# Altium footprint library MyPcbLib.PcbLib: 657 footprints (part 22 of 42)
Each footprint in its own frame and in the unit in brackets; x right, y up, seen from the top. Pads: shape width x height; smd on the part's side, far side on the other; paste and mask are expansions set on the pad; w line width, h text height; cw(c..) or ccw(c..) is an arc to the next point about the centre after c.
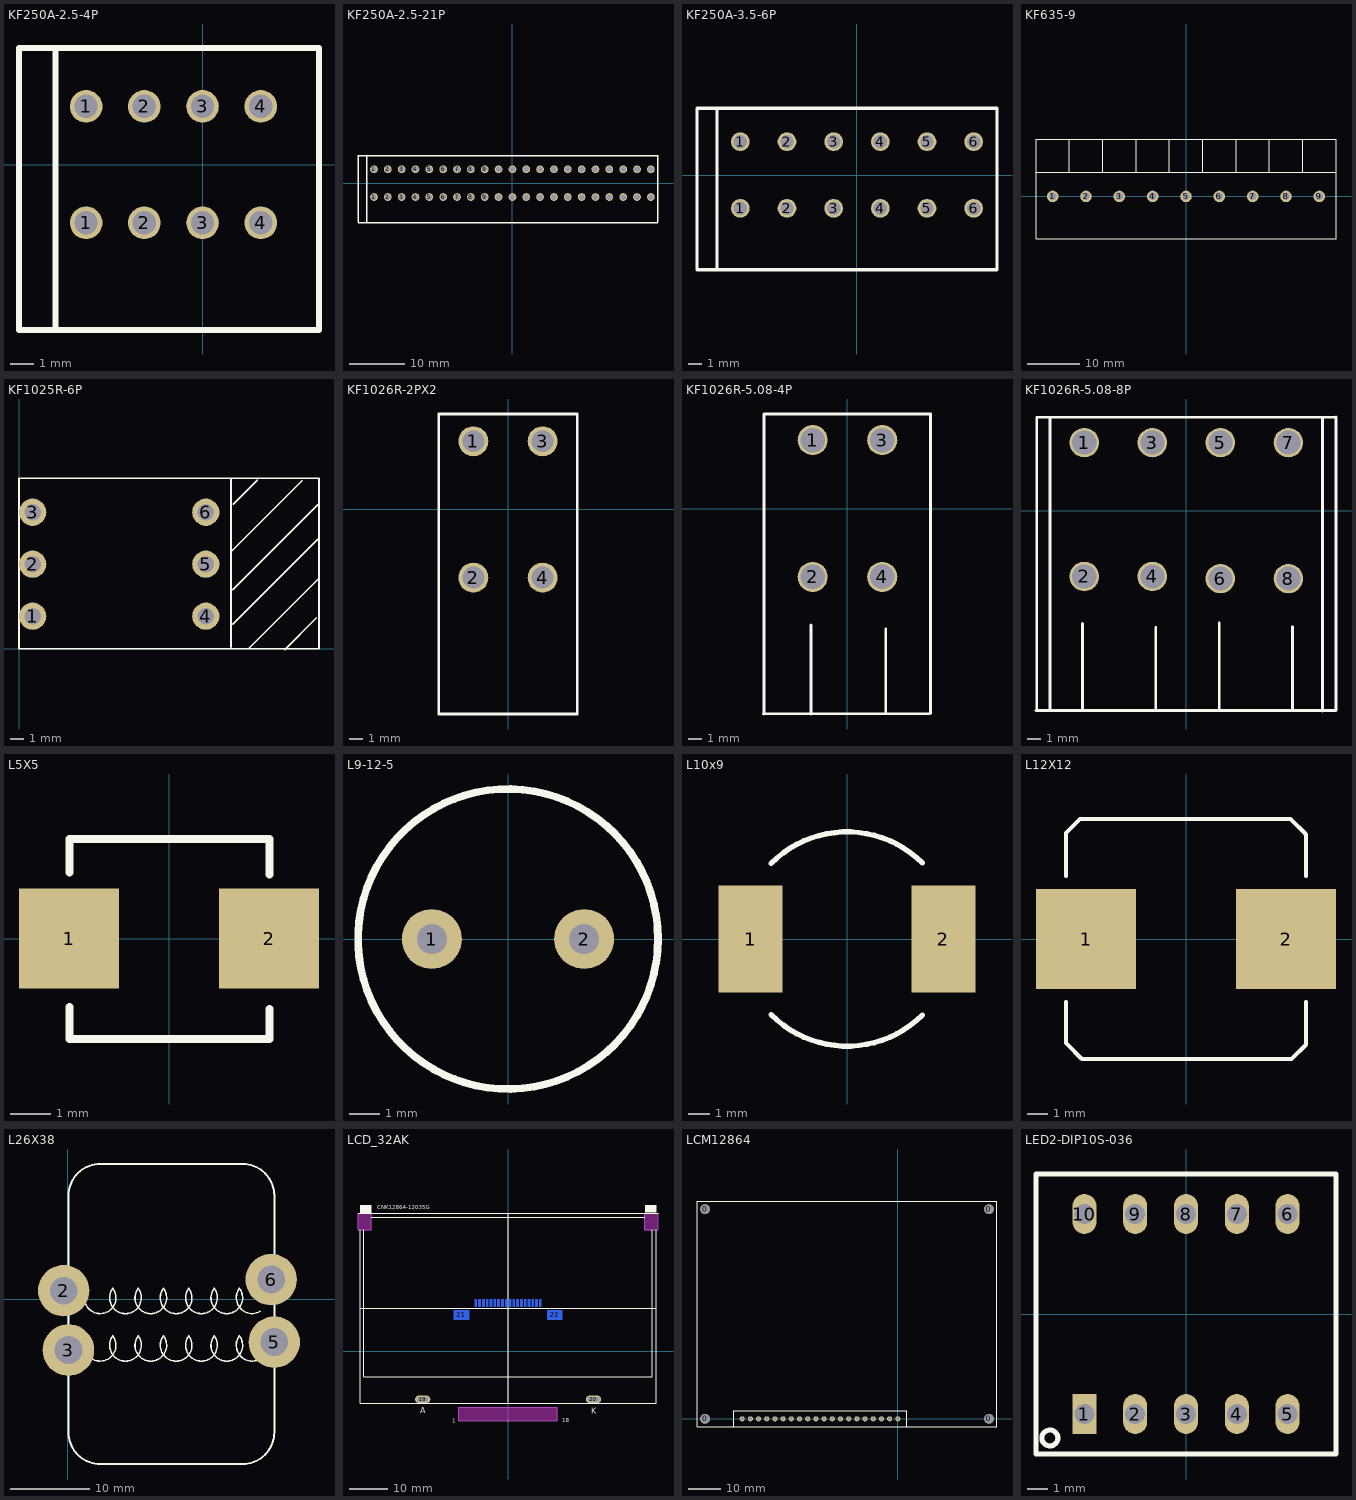
[diagram p21: the footprints below, top view; thin cyan lines are the x and y axes]

## KF250A-2.5-4P [mm]
pads (8):
  round 1.4 hole 1: 1(-5,-2.5) 1(-5,2.5) 2(-2.5,-2.5) 2(-2.5,2.5) 3(0,-2.5) 3(0,2.5) 4(2.5,-2.5) 4(2.5,2.5)
Top Overlay:
  lines w0.254: -7.881,-7.1 5,-7.1 5,5 -7.881,5 ; -7.881,-7.061 -7.881,5.004 ; -6.314,-7.036 -6.314,5.004

## KF250A-2.5-21P [mm]
pads (42):
  round 1.4 hole 1: 1(-25,-2.5) 1(-25,2.5) 2(-22.5,-2.5) 2(-22.5,2.5) 3(-20,-2.5) 3(-20,2.5) 4(-17.5,-2.5) 4(-17.5,2.5) 5(-15,-2.5) 5(-15,2.5) 6(-12.5,-2.5) 6(-12.5,2.5) 7(-10,-2.5) 7(-10,2.5) 8(-7.5,-2.5) 8(-7.5,2.5) 9(-5,-2.5) 9(-5,2.5) 10(-2.5,-2.5) 10(-2.5,2.5) 11(0,-2.5) 11(0,2.5) 12(2.5,-2.5) 12(2.5,2.5) 13(5,-2.5) 13(5,2.5) 14(7.5,-2.5) 14(7.5,2.5) 15(10,-2.5) 15(10,2.5) 16(12.5,-2.5) 16(12.5,2.5) 17(15,-2.5) 17(15,2.5) 18(17.5,-2.5) 18(17.5,2.5) 19(20,-2.5) 19(20,2.5) 20(22.5,-2.5) 20(22.5,2.5) 21(25,-2.5) 21(25,2.5)
Top Overlay:
  lines w0.254: -27.881,-7.1 26.25,-7.1 ; -27.881,-7.061 -27.881,5.004 ; -27.881,5 26.25,5 ; -26.314,-7.036 -26.314,5.004 ; 26.289,-7.087 26.289,5.004

## KF250A-3.5-6P [mm]
pads (12):
  round 1.4 hole 1: 1(-8.75,-2.5) 1(-8.75,2.5) 2(-5.25,-2.5) 2(-5.25,2.5) 3(-1.75,-2.5) 3(-1.75,2.5) 4(1.75,-2.5) 4(1.75,2.5) 5(5.25,-2.5) 5(5.25,2.5) 6(8.75,-2.5) 6(8.75,2.5)
Top Overlay:
  lines w0.254: -10.5,-7.036 -10.5,5.004 ; -12,-7.1 10.5,-7.1 10.5,5 -12,5 -12,-7.1

## KF635-9 [mm]
pads (9):
  round 2.2 hole 1.4: 1(-25.4,0) 2(-19.05,0) 3(-12.7,0) 4(-6.35,0) 5(0,0) 6(6.35,0) 7(12.7,0) 8(19.05,0) 9(25.4,0)
Top Overlay:
  lines w0.203: -28.575,4.572 -28.575,10.922 28.575,10.922 28.575,4.572 ; -22.225,4.572 -22.225,10.922 ; -15.875,4.572 -15.875,10.922 ; -9.525,4.572 -9.525,10.922 ; -3.175,4.572 -3.175,10.922 ; 3.175,4.572 3.175,10.922 ; 9.525,4.572 9.525,10.922 ; 15.875,4.572 15.875,10.922 ; 22.225,4.572 22.225,10.922 ; -28.575,-8.1 -28.575,4.6 28.575,4.6 28.575,-8.1 -28.575,-8.1
3D body: height 21.6, standoff -1.6, extent -28.738,-8.077 28.382,4.923

## KF1025R-6P [mm]
pads (6):
  round 2 hole 1.2: 1(1,2.39) 2(1,6.2) 3(1,10.01) 4(13.7,2.39) 5(13.7,6.2) 6(13.7,10.01)
Top Overlay:
  lines w0.127: 15.605,7.165 20.755,12.315 ; 15.685,1.805 21.92,8.04 ; 15.685,4.335 21.9,10.55 ; 15.71,10.6 17.48,12.37 ; 16.855,0.015 22.005,5.165 ; 19.49,-0.07 21.81,2.25 ; 0,0 0,12.5 22,12.5 22,0 0,0 ; 15.54,0.12 15.54,12.45 15.56,12.45 15.56,0.12 15.54,0.12

## KF1026R-2PX2 [mm]
pads (4):
  round 2.2 hole 1.6: 1(-2.54,5) 2(-2.54,-5) 3(2.54,5) 4(2.54,-5)
Top Overlay:
  lines w0.203: -5.08,-15 -5.08,7 5.08,7 5.08,-15 -5.08,-15

## KF1026R-5.08-4P [mm]
pads (4):
  round 2.2 hole 1.8: 1(-2.54,5) 2(-2.54,-5) 3(2.54,5) 4(2.54,-5)
Top Overlay:
  lines w0.203: -6.147,-15 6.02,-15 ; -6.096,-15.015 -6.096,6.88 ; -6.08,6.9 6.08,6.9 ; -2.667,-15.011 -2.667,-8.509 ; 2.794,-14.935 2.794,-8.814 ; 6.071,-14.964 6.071,6.905

## KF1026R-5.08-8P [mm]
pads (8):
  round 2.2 hole 1.8: 1(-7.62,5.08) 2(-7.62,-4.92) 3(-2.54,5.08) 4(-2.54,-4.92) 5(2.54,5.08) 6(2.54,-5.08) 7(7.62,5.08) 8(7.62,-5.08)
Top Overlay:
  lines w0.203: -11.227,-14.92 11.176,-14.92 ; -11.176,-14.935 -11.176,6.96 ; -11.16,6.98 11.176,6.98 ; -10.176,-14.935 -10.176,6.96 ; -7.747,-14.931 -7.747,-8.429 ; -2.286,-14.855 -2.286,-8.734 ; 2.464,-14.881 2.464,-8.378 ; 7.925,-14.804 7.925,-8.683 ; 10.176,-14.961 10.176,6.934 ; 11.176,-14.884 11.176,6.985

## L5X5 [mm]
pads (2):
  rect 2.5x2.5 smd: 1(-2.5,0) 2(2.5,0)
Top Overlay:
  lines w0.203: -2.492,-1.704 -2.492,-2.508 2.508,-2.508 2.508,-1.759 ; -2.492,1.653 -2.492,2.492 2.508,2.492 2.508,1.606

## L9-12-5 [mm]
pads (2):
  round 2 hole 1: 1(-2.54,0) 2(2.54,0)
Top Overlay:
  circle w0.254: c0,0 r5
3D body: height 14, standoff -2, extent -4.92,-4.92 5.08,5.08

## L10x9 [mm]
pads (2):
  rect 3x5 smd: 1(-4.5,0) 2(4.5,0)
Top Overlay:
  lines w0.254: -3.547,-3.524 ccw(c0,0) 3.524,-3.547 ; -3.547,3.524 cw(c0,0) 3.524,3.547

## L12X12 [mm]
pads (2):
  rect 5x5 smd: 1(-5,0) 2(5,0)
Top Overlay:
  lines w0.203: -6,-3.155 -6,-5.201 -5.201,-6 5.278,-6 6,-5.278 6,-3.155 ; -6,3.155 -6,5.309 ; -5.929,-5.272 -5.238,-5.963 ; 5.272,5.955 5.963,5.263 ; 5.297,-5.98 5.989,-5.289 ; 6,3.155 6,5.227 5.227,6 -5.309,6 ; -6,5.309 -5.309,6 ; -6,5.309 -5.309,6

## L26X38 [mm]
pads (4):
  round 6.5 hole 3.5: 2(-0.5,1.1) 3(0.1,-6.4) 5(26.1,-5.4) 6(25.7,2.5)
Top Overlay:
  lines w0.2: 2.1,-5.8 ccw(c4.1,-5.8) 5.7,-4.6 ccw(c7.3,-5.8) 8.9,-4.6 ccw(c10.5,-5.8) 12.1,-4.6 ccw(c13.7,-5.8) 15.3,-4.6 ccw(c16.9,-5.8) 18.5,-4.6 ccw(c20.1,-5.8) 21.7,-4.6 ccw(c23.3,-5.8) 24.271,-7.548 ; 2.1,0.2 ccw(c4.1,0.2) 5.7,1.4 ccw(c7.3,0.2) 8.9,1.4 ccw(c10.5,0.2) 12.1,1.4 ccw(c13.7,0.2) 15.3,1.4 ccw(c16.9,0.2) 18.5,1.4 ccw(c20.1,0.2) 21.7,1.4 ccw(c23.3,0.2) 24.314,-1.524
  lines w0.25: 0.1,-16.9 0.1,13.1 cw(c4.1,13.1) 4.1,17.1 22.1,17.1 cw(c22.1,13.1) 26.1,13.1 ; 0.1,-16.8 ccw(c4.1,-16.8) 4.1,-20.8 ; 4.2,-20.8 22.2,-20.8 ; 22.1,-20.8 ccw(c22.1,-16.8) 26.1,-16.8 ; 26.1,-16.7 26.1,13.3

## LCD_32AK [mm]
pads (22):
  rect 0.6x2 smd far side: 1(-8.5,12.699) 2(-7.5,12.699) 3(-6.5,12.699) 4(-5.5,12.699) 5(-4.5,12.699) 6(-3.5,12.699) 7(-2.5,12.699) 8(-1.5,12.699) 9(-0.5,12.699) 10(0.5,12.699) 11(1.5,12.699) 12(2.5,12.699) 13(3.5,12.699) 14(4.5,12.699) 15(5.5,12.699) 16(6.5,12.699) 17(7.5,12.699) 18(8.5,12.699)
  oval 4x2 hole 1.2 slot 3 at 0 deg: 19(-22.5,-12.699) 20(22.5,-12.699)
  rect 4x2.5 smd far side: 21(-12.3,9.549)
  rect 4x2.5 smd far side paste+0 mask+0.102: 22(12.3,9.549)
Top Overlay:
  rectangle: -39.017,36.447 -36.017,38.447
  rectangle: 36.065,36.473 39.065,38.473
  lines w0.203: -39.5,36.282 39.497,36.282 ; -38.989,11.282 39.011,11.282 ; -38.989,32 -38.989,-13.718 39.011,-13.718 39.011,32 ; -37.998,32 -37.998,-6.707 37.998,-6.707 37.998,32 ; -36,35.301 36,35.301 ; 0.011,-13.514 0.011,36.282
  text "CNK12864-12035G" at -34.493,37.363 h1.02
  text "A" at -23.114,-16.334 h1.52
  text "K" at 21.869,-16.435 h1.52
  text "1" at -14.707,-18.898 h1.02
  text "18" at 14.224,-18.745 h1.02
Bottom Overlay:
  lines w0.254: -14,7.124 14,7.124 ; -14,11.5 -14,15.124 14,15.124 14,11.5
  text "P1" at -10.465,12.343 h1.02
Keep-Out Layer:
  board cut-out: -36,36.246 -36,36.22 -36,32.029 -36,32.004 -39.522,32.004 -39.548,31.979 -39.548,36.22 -39.522,36.246
  board cut-out: 39.395,36.271 39.421,36.246 39.421,32.055 39.446,32.029 36,32.029 36,32.004 36,36.246 36,36.271
  board cut-out: -13.005,-14.757 12.979,-14.757 13.005,-14.783 13.005,-18.136 -12.979,-18.136 -12.979,-14.783
Keep-Out Layer:
  lines w0.203: -39.5,32 -39.5,36.295 -36,36.295 -36,32 -39.5,32 ; -13,-18.212 13,-18.212 13,-14.732 -13,-14.732 -13,-18.212 ; 36,32.025 39.472,32.025 39.472,36.32 36,36.32 36,32.025
Mechanical 1:
  lines w0.203: -39.5,32 -36,32 -36,36.27 -39.5,36.27 -39.5,32 ; -13,-18.288 -13,-14.732 13,-14.732 13,-18.288 -13,-18.288 ; 36,32.025 36,36.295 39.497,36.295 39.497,32.025 36,32.025

## LCM12864 [mm]
pads (24):
  round 3 hole 3: 0(-59.76,0) 0(-59.76,65) 0(28.24,0) 0(28.24,65)
  round 1.6 hole 1: 1(0,0) 2(-2.54,0) 3(-5.08,0) 4(-7.62,0) 5(-10.16,0) 6(-12.7,0) 7(-15.24,0) 8(-17.78,0) 9(-20.32,0) 10(-22.86,0) 11(-25.4,0) 12(-27.94,0) 13(-30.48,0) 14(-33.02,0) 15(-35.56,0) 16(-38.1,0) 17(-40.64,0) 18(-43.18,0) 19(-45.72,0) 20(-48.26,0)
Top Overlay:
  lines w0.203: -50.8,-2.5 -50.8,2.5 2.819,2.5 2.819,-2.5 ; -62.26,-2.5 -62.26,67.5 30.74,67.5 30.74,-2.5 -62.26,-2.5
3D body: height 1, standoff -19.6, extent -63.645,-2.642 29.355,67.358

## LED2-DIP10S-036 [mm]
pads (10):
  rect 1.2x2 hole 1: 1(-5.08,-5)
  oval 1.2x2 hole 1: 2(-2.54,-5) 3(0,-5) 4(2.54,-5) 5(5.08,-5) 6(5.08,5) 7(2.54,5) 8(0,5) 9(-2.54,5) 10(-5.08,5)
Top Overlay:
  circle w0.254: c-6.807,-6.198 r0.4
  lines w0.254: -7.5,-7 -7.5,7 7.5,7 7.5,-7 -7.5,-7